# Altium schematic symbol library FPGA_Xilinx_Virtex7.SchLib: 34 symbols (part 29 of 34) (continued)
## XC7VX980T-FFG1926 (continued)
part P pins: A39 MGTHRXP3_218 (io), A40 MGTHRXN3_218 (io), B41 MGTHTXP3_218 (io), B42 MGTHTXN3_218 (io), C39 MGTHRXP2_218 (io), C40 MGTHRXN2_218 (io), C43 MGTHTXP2_218 (io), C44 MGTHTXN2_218 (io), D37 MGTREFCLK0P_218 (io), D38 MGTREFCLK0N_218 (io), D41 MGTHRXP1_218 (io), D42 MGTHRXN1_218 (io), E39 MGTHRXP0_218 (io), E40 MGTHRXN0_218 (io), E43 MGTHTXP1_218 (io), E44 MGTHTXN1_218 (io), F37 MGTREFCLK1P_218 (io), F38 MGTREFCLK1N_218 (io), F41 MGTHTXP0_218 (io), F42 MGTHTXN0_218 (io), G39 MGTHRXP3_217 (io), G40 MGTHRXN3_217 (io), G43 MGTHTXP3_217 (io), G44 MGTHTXN3_217 (io), H41 MGTHRXP2_217 (io), H42 MGTHRXN2_217 (io), J39 MGTHRXP1_217 (io), J40 MGTHRXN1_217 (io), J43 MGTHTXP2_217 (io), J44 MGTHTXN2_217 (io), K37 MGTREFCLK0P_217 (io), K38 MGTREFCLK0N_217 (io), K41 MGTHTXP1_217 (io), K42 MGTHTXN1_217 (io), L39 MGTHRXP0_217 (io), L40 MGTHRXN0_217 (io), L43 MGTHTXP0_217 (io), L44 MGTHTXN0_217 (io), M37 MGTREFCLK1P_217 (io), M38 MGTREFCLK1N_217 (io)
part Q pins: AA8 MGTAVCC_G11 (power), AA37 MGTAVCC_G21 (power), AB6 MGTAVCC_G11 (power), AB39 MGTAVCC_G21 (power), AC4 MGTAVTT_G11 (power), AC41 MGTAVTT_G21 (power), AD2 MGTAVTT_G11 (power), AD43 MGTAVTT_G21 (power), AE8 MGTAVCC_G11 (power), AE37 MGTAVCC_G21 (power), AF6 MGTAVCC_G11 (power), AF39 MGTAVCC_G21 (power), AG4 MGTAVTT_G11 (power), AG41 MGTAVTT_G21 (power), AH2 MGTAVTT_G11 (power), AH43 MGTAVTT_G21 (power), AJ8 MGTAVCC_G11 (power), AJ37 MGTAVCC_G21 (power), AK6 MGTAVCC_G11 (power), AK39 MGTAVCC_G21 (power), AL4 MGTAVTT_G11 (power), AL41 MGTAVTT_G21 (power), AM2 MGTAVTT_G11 (power), AM43 MGTAVTT_G21 (power), AN8 MGTVCCAUX_G10 (power), AN37 MGTVCCAUX_G20 (power), AP6 MGTAVCC_G10 (power), AP39 MGTAVCC_G20 (power), AR4 MGTAVTT_G10 (power), AR8 MGTAVCC_G10 (power), AR37 MGTAVCC_G20 (power), AR41 MGTAVTT_G20 (power), AT2 MGTAVTT_G10 (power), AT43 MGTAVTT_G20 (power), AV6 MGTAVCC_G10 (power), AV39 MGTAVCC_G20 (power), AW4 MGTAVTT_G10 (power), AW8 MGTAVCC_G10 (power), AW37 MGTAVCC_G20 (power), AW41 MGTAVTT_G20 (power), AY2 MGTAVTT_G10 (power), AY43 MGTAVTT_G20 (power), B6 MGTAVCC_G12 (power), B39 MGTAVCC_G22 (power), BB6 MGTAVCC_G10 (power), BB39 MGTAVCC_G20 (power), BC4 MGTAVTT_G10 (power), BC41 MGTAVTT_G20 (power), C4 MGTAVTT_G12 (power), C41 MGTAVTT_G22 (power), D2 MGTAVTT_G12 (power), D43 MGTAVTT_G22 (power), E8 MGTAVCC_G12 (power), E37 MGTAVCC_G22 (power), F6 MGTAVCC_G12 (power), F39 MGTAVCC_G22 (power), G4 MGTAVTT_G12 (power), G41 MGTAVTT_G22 (power), H2 MGTAVTT_G12 (power), H43 MGTAVTT_G22 (power), J8 MGTAVCC_G12 (power), J37 MGTAVCC_G22 (power), K6 MGTAVCC_G12 (power), K39 MGTAVCC_G22 (power), L4 MGTAVTT_G12 (power), L41 MGTAVTT_G22 (power), M2 MGTAVTT_G12 (power), M43 MGTAVTT_G22 (power), N8 MGTAVCC_G12 (power), N37 MGTAVCC_G22 (power), P6 MGTAVCC_G12 (power), P39 MGTAVCC_G22 (power), R4 MGTAVTT_G12 (power), R41 MGTAVTT_G22 (power), T2 MGTAVTT_G12 (power), T43 MGTAVTT_G22 (power), U8 MGTVCCAUX_G12 (power), U37 MGTVCCAUX_G22 (power), V6 MGTAVCC_G11 (power), V39 MGTAVCC_G21 (power), W4 MGTAVTT_G11 (power), W8 MGTVCCAUX_G11 (power), W37 MGTVCCAUX_G21 (power), W41 MGTAVTT_G21 (power), Y2 MGTAVTT_G11 (power), Y7 MGTAVTTRCAL_115 (power), Y8 MGTRREF_115 (power), Y37 MGTRREF_215 (power), Y38 MGTAVTTRCAL_215 (power), Y43 MGTAVTT_G21 (power)
part R pins: AA10 CFGBVS_0 (io), AA35 TDO_0 (io), AB11 M1_0 (io), AB22 VREFN_0 (io), AB23 VP_0 (io), AC10 M0_0 (io), AC22 VN_0 (io), AC23 VREFP_0 (io), AC35 TCK_0 (io), AD11 M2_0 (io), AD22 DXN_0 (io), AD23 DXP_0 (io), AD35 VCCO_0 (power), AE10 DONE_0 (io), AE35 TDI_0 (io), AF35 VCCO_0 (power), AG35 TMS_0 (io), W10 INIT_B_0 (io), W35 CCLK_0 (io), Y11 PROGRAM_B_0 (io)
part S pins: A3 GND (power), A4 GND (power), A7 GND (power), A12 GND (power), A22 GND (power), A32 GND (power), A38 GND (power), A41 GND (power), A42 GND (power), AA11 VCCINT (power), AA13 VCCINT (power), AA15 VCCINT (power), AA17 VCCAUX (power), AA19 VCCINT (power), AA21 VCCINT (power), AA22 GNDADC_0 (power), AA23 VCCADC_0 (power), AA25 VCCAUX_IO_G1 (power), AA27 VCCAUX (power), AA29 VCCINT (power), AA31 VCCINT (power), AA33 VCCINT (power), AB12 VCCINT (power), AB14 VCCINT (power), AB16 VCCINT (power), AB18 VCCAUX_IO_G4 (power), AB20 VCCINT (power), AB24 VCCBRAM (power), AB26 VCCAUX_IO_G1 (power), AB28 VCCINT (power), AB30 VCCINT (power), AB32 VCCINT (power), AB34 VCCINT (power), AC11 VCCINT (power), AC13 VCCINT (power), AC15 VCCINT (power), AC17 VCCAUX (power), AC19 VCCINT (power), AC21 VCCINT (power), AC25 VCCAUX_IO_G1 (power), AC27 VCCAUX (power), AC29 VCCINT (power), AC31 VCCINT (power), AC33 VCCINT (power), AD12 VCCINT (power), AD14 VCCINT (power), AD16 VCCINT (power), AD18 VCCAUX_IO_G4 (power), AD20 VCCINT (power), AD24 VCCBRAM (power), AD26 VCCAUX_IO_G0 (power), AD28 VCCINT (power), AD30 VCCINT (power), AD32 VCCINT (power), AD34 VCCINT (power), AE11 VCCINT (power), AE13 VCCINT (power), AE15 VCCINT (power), AE17 VCCAUX (power), AE19 VCCAUX_IO_G3 (power), AE21 VCCINT (power), AE23 VCCBRAM (power), AE25 VCCAUX_IO_G0 (power), AE27 VCCAUX (power), AE29 VCCINT (power), AE31 VCCINT (power), AE33 VCCINT (power), AF12 VCCINT (power), AF14 VCCINT (power), AF16 VCCINT (power), AF18 VCCAUX_IO_G3 (power), AF20 VCCINT (power), AF22 VCCINT (power), AF24 VCCBRAM (power), AF26 VCCAUX_IO_G0 (power), AF28 VCCINT (power), AF30 VCCINT (power), AF32 VCCINT (power), AF34 VCCINT (power), AG11 VCCINT (power), AG13 VCCINT (power), AG15 VCCINT (power), AG17 VCCAUX (power), AG19 VCCAUX_IO_G3 (power), AG21 VCCINT (power), AG23 VCCINT (power), AG25 VCCBRAM (power), AG27 VCCAUX (power), AG29 VCCINT (power), AG31 VCCINT (power), AG33 VCCINT (power), AH14 VCCINT (power), AH20 VCCINT (power), AH22 VCCINT (power), AH24 VCCBRAM (power), AH32 VCCINT (power), AH34 VCCINT (power), B2 GND (power), B5 GND (power), B7 GND (power), B9 GND (power), B19 GND (power), B29 GND (power), B38 GND (power), B40 GND (power), B43 GND (power), C3 GND (power), C7 GND (power), C8 GND (power), C9 GND (power), C16 GND (power), C26 GND (power), C36 GND (power), C37 GND (power), C38 GND (power), C42 GND (power), D1 GND (power), D5 GND (power), D6 GND (power), D9 GND (power), D13 GND (power), D23 GND (power), D33 GND (power), D36 GND (power), D39 GND (power), D40 GND (power), D44 GND (power), E3 GND (power), E4 GND (power), E7 GND (power), E9 GND (power), E10 GND (power), E20 GND (power), E30 GND (power), E36 GND (power), E38 GND (power), E41 GND (power), E42 GND (power), F1 GND (power), F2 GND (power), F5 GND (power), F9 GND (power), F17 GND (power), F27 GND (power), F36 GND (power), F40 GND (power), F43 GND (power), F44 GND (power), G3 GND (power), G7 GND (power), G8 GND (power), G9 GND (power), G14 GND (power), G24 GND (power), G34 GND (power), G36 GND (power), G37 GND (power), G38 GND (power), G42 GND (power), H1 GND (power), H5 GND (power), H6 GND (power), H9 GND (power), H11 GND (power), H21 GND (power), H31 GND (power), H36 GND (power), H39 GND (power), H40 GND (power), H44 GND (power), J3 GND (power), J4 GND (power), J7 GND (power), J9 GND (power), J18 GND (power), J28 GND (power), J36 GND (power), J38 GND (power), J41 GND (power), J42 GND (power), K1 GND (power), K2 GND (power), K5 GND (power), K9 GND (power), K15 GND (power), K25 GND (power), K35 GND (power), K36 GND (power), U35 VCCBATT_0 (power), V12 VCCINT (power), V14 VCCINT (power), V24 VCCBRAM (power), V26 VCCAUX_IO_G2 (power), V34 VCCINT (power), W11 VCCINT (power), W13 VCCINT (power), W15 VCCINT (power), W17 VCCAUX (power), W19 VCCAUX_IO_G5 (power), W21 VCCINT (power), W23 VCCBRAM (power), W25 VCCBRAM (power), W27 VCCAUX (power), W29 VCCINT (power), W31 VCCINT (power), W33 VCCINT (power), Y12 VCCINT (power), Y14 VCCINT (power), Y16 VCCINT (power), Y18 VCCAUX_IO_G4 (power), Y20 VCCINT (power), Y22 VCCINT (power), Y24 VCCBRAM (power), Y26 VCCAUX_IO_G2 (power), Y28 VCCINT (power), Y30 VCCINT (power), Y32 VCCINT (power), Y34 VCCINT (power)
part T pins: AA3 GND (power), AA4 GND (power), AA7 GND (power), AA9 GND (power), AA12 GND (power), AA14 GND (power), AA16 GND (power), AA18 GND (power), AA20 GND (power), AA24 GND (power), AA26 GND (power), AA28 GND (power), AA30 GND (power), AA32 GND (power), AA34 GND (power), AA36 GND (power), AA38 GND (power), AA41 GND (power), AA42 GND (power), AB1 GND (power), AB2 GND (power), AB5 GND (power), AB9 GND (power), AB10 GND (power), AB13 GND (power), AB15 GND (power), AB17 GND (power), AB19 GND (power), AB21 GND (power), AB25 GND (power), AB27 GND (power), AB29 GND (power), AB31 GND (power), AB33 GND (power), AB35 GND (power), AB36 GND (power), AB40 GND (power), AB43 GND (power), AB44 GND (power), AC3 GND (power), AC7 GND (power), AC8 GND (power), AC9 GND (power), AC12 GND (power), AC14 GND (power), AC16 GND (power), AC18 GND (power), AC20 GND (power), AC24 GND (power), AC26 GND (power), AC28 GND (power), AC30 GND (power), AC32 GND (power), AC34 GND (power), AC36 GND (power), AC37 GND (power), AC38 GND (power), AC42 GND (power), AD1 GND (power), AD5 GND (power), AD6 GND (power), AD9 GND (power), AD10 GND (power), AD13 GND (power), AD15 GND (power), AD17 GND (power), AD19 GND (power), AD21 GND (power), AD25 GND (power), AD27 GND (power), AD29 GND (power), AD31 GND (power), AD33 GND (power), AD36 GND (power), AD39 GND (power), AD40 GND (power), AD44 GND (power), AE3 GND (power), AE4 GND (power), AE7 GND (power), AE9 GND (power), AE12 GND (power), AE14 GND (power), AE16 GND (power), AE18 GND (power), AE20 GND (power), AE22 GND (power), AE24 GND (power), AE26 GND (power), AE28 GND (power), AE30 GND (power), AE32 GND (power), AE34 GND (power), AE36 GND (power), AE38 GND (power), AE41 GND (power), AE42 GND (power), AF1 GND (power), AF2 GND (power), AF5 GND (power), AF9 GND (power), AF10 GND (power), AF11 GND (power), AF13 GND (power), AF15 GND (power), AF17 GND (power), AF19 GND (power), AF21 GND (power), AF23 GND (power), AF25 GND (power), AF27 GND (power), AF29 GND (power), AF31 GND (power), AF33 GND (power), AF36 GND (power), AF40 GND (power), AF43 GND (power), AF44 GND (power), AG3 GND (power), AG7 GND (power), AG8 GND (power), AG9 GND (power), AG10 GND (power), AG12 GND (power), AG14 GND (power), AG16 GND (power), AG18 GND (power), AG20 GND (power), AG22 GND (power), AG24 GND (power), AG26 GND (power), AG28 GND (power), AG30 GND (power), AG32 GND (power), AG34 GND (power), AG36 GND (power), AG37 GND (power), AG38 GND (power), AG42 GND (power), AH1 GND (power), AH5 GND (power), AH6 GND (power), AH9 GND (power), AH11 GND (power), AH13 GND (power), AH15 GND (power), AH19 GND (power), AH21 GND (power), AH23 GND (power), AH25 GND (power), AH31 GND (power), AH33 GND (power), AH35 GND (power), AH36 GND (power), AH39 GND (power), AH40 GND (power), AH44 GND (power), AJ3 GND (power), AJ4 GND (power), AJ7 GND (power), AJ9 GND (power), AJ18 GND (power), AJ28 GND (power), AJ36 GND (power), AJ38 GND (power), AJ41 GND (power), AJ42 GND (power), AK1 GND (power), AK2 GND (power), K40 GND (power), K43 GND (power), K44 GND (power), L3 GND (power), L7 GND (power), L8 GND (power), L9 GND (power), L12 GND (power), L22 GND (power), L32 GND (power), L36 GND (power), L37 GND (power), L38 GND (power), L42 GND (power), M1 GND (power), M5 GND (power), M6 GND (power), M9 GND (power), M19 GND (power), M29 GND (power), M36 GND (power), M39 GND (power), M40 GND (power), M44 GND (power), N3 GND (power), N4 GND (power), N7 GND (power), N9 GND (power), N16 GND (power), N26 GND (power), N36 GND (power), N38 GND (power), N41 GND (power), N42 GND (power), P1 GND (power), P2 GND (power), P5 GND (power), P9 GND (power), P13 GND (power), P23 GND (power), P33 GND (power), P36 GND (power), P40 GND (power), P43 GND (power), P44 GND (power), R3 GND (power), R7 GND (power), R8 GND (power), R9 GND (power), R10 GND (power), R20 GND (power), R30 GND (power), R36 GND (power), R37 GND (power), R38 GND (power), R42 GND (power), T1 GND (power), T5 GND (power), T6 GND (power), T9 GND (power), T17 GND (power), T27 GND (power), T34 GND (power), T35 GND (power), T36 GND (power), T39 GND (power), T40 GND (power), T44 GND (power), U3 GND (power), U4 GND (power), U7 GND (power), U9 GND (power), U14 GND (power), U24 GND (power), U34 GND (power), U36 GND (power), U38 GND (power), U41 GND (power), U42 GND (power), V1 GND (power), V2 GND (power), V5 GND (power), V9 GND (power), V10 GND (power), V11 GND (power), V21 GND (power), V23 GND (power), V25 GND (power), V31 GND (power), V35 GND (power), V36 GND (power), V40 GND (power), V43 GND (power), V44 GND (power), W3 GND (power), W7 GND (power), W9 GND (power), W12 GND (power), W14 GND (power), W16 GND (power), W18 GND (power), W20 GND (power), W22 GND (power), W24 GND (power), W26 GND (power), W28 GND (power), W30 GND (power), W32 GND (power), W34 GND (power), W36 GND (power), W38 GND (power), W42 GND (power), Y1 GND (power), Y5 GND (power), Y6 GND (power), Y9 GND (power), Y10 GND (power), Y13 GND (power), Y15 GND (power), Y17 GND (power), Y19 GND (power), Y21 GND (power), Y23 GND (power), Y25 GND (power), Y27 GND (power), Y29 GND (power), Y31 GND (power), Y33 GND (power), Y35 GND (power), Y36 GND (power), Y39 GND (power), Y40 GND (power), Y44 GND (power)
part U pins: AK5 GND (power), AK9 GND (power), AK15 GND (power), AK25 GND (power), AK35 GND (power), AK36 GND (power), AK40 GND (power), AK43 GND (power), AK44 GND (power), AL3 GND (power), AL7 GND (power), AL8 GND (power), AL9 GND (power), AL12 GND (power), AL22 GND (power), AL32 GND (power), AL36 GND (power), AL37 GND (power), AL38 GND (power), AL42 GND (power), AM1 GND (power), AM5 GND (power), AM6 GND (power), AM9 GND (power), AM19 GND (power), AM29 GND (power), AM36 GND (power), AM39 GND (power), AM40 GND (power), AM44 GND (power), AN3 GND (power), AN4 GND (power), AN7 GND (power), AN9 GND (power), AN16 GND (power), AN26 GND (power), AN36 GND (power), AN38 GND (power), AN41 GND (power), AN42 GND (power), AP1 GND (power), AP2 GND (power), AP5 GND (power), AP9 GND (power), AP13 GND (power), AP23 GND (power), AP33 GND (power), AP36 GND (power), AP40 GND (power), AP43 GND (power), AP44 GND (power), AR3 GND (power), AR7 GND (power), AR9 GND (power), AR10 GND (power), AR20 GND (power), AR30 GND (power), AR36 GND (power), AR38 GND (power), AR42 GND (power), AT1 GND (power), AT5 GND (power), AT6 GND (power), AT9 GND (power), AT17 GND (power), AT27 GND (power), AT36 GND (power), AT39 GND (power), AT40 GND (power), AT44 GND (power), AU3 GND (power), AU4 GND (power), AU7 GND (power), AU8 GND (power), AU9 GND (power), AU14 GND (power), AU24 GND (power), AU34 GND (power), AU36 GND (power), AU37 GND (power), AU38 GND (power), AU41 GND (power), AU42 GND (power), AV1 GND (power), AV2 GND (power), AV5 GND (power), AV9 GND (power), AV11 GND (power), AV21 GND (power), AV31 GND (power), AV36 GND (power), AV40 GND (power), AV43 GND (power), AV44 GND (power), AW3 GND (power), AW7 GND (power), AW9 GND (power), AW18 GND (power), AW28 GND (power), AW36 GND (power), AW38 GND (power), AW42 GND (power), AY1 GND (power), AY5 GND (power), AY6 GND (power), AY9 GND (power), AY15 GND (power), AY25 GND (power), AY35 GND (power), AY36 GND (power), AY39 GND (power), AY40 GND (power), AY44 GND (power), BA3 GND (power), BA4 GND (power), BA7 GND (power), BA8 GND (power), BA9 GND (power), BA12 GND (power), BA22 GND (power), BA32 GND (power), BA36 GND (power), BA37 GND (power), BA38 GND (power), BA41 GND (power), BA42 GND (power), BB1 GND (power), BB2 GND (power), BB5 GND (power), BB7 GND (power), BB9 GND (power), BB19 GND (power), BB29 GND (power), BB38 GND (power), BB40 GND (power), BB43 GND (power), BB44 GND (power), BC2 GND (power), BC3 GND (power), BC7 GND (power), BC16 GND (power), BC26 GND (power), BC36 GND (power), BC38 GND (power), BC42 GND (power), BC43 GND (power), BD5 GND (power), BD6 GND (power), BD7 GND (power), BD13 GND (power), BD23 GND (power), BD33 GND (power), BD38 GND (power), BD39 GND (power), BD40 GND (power)

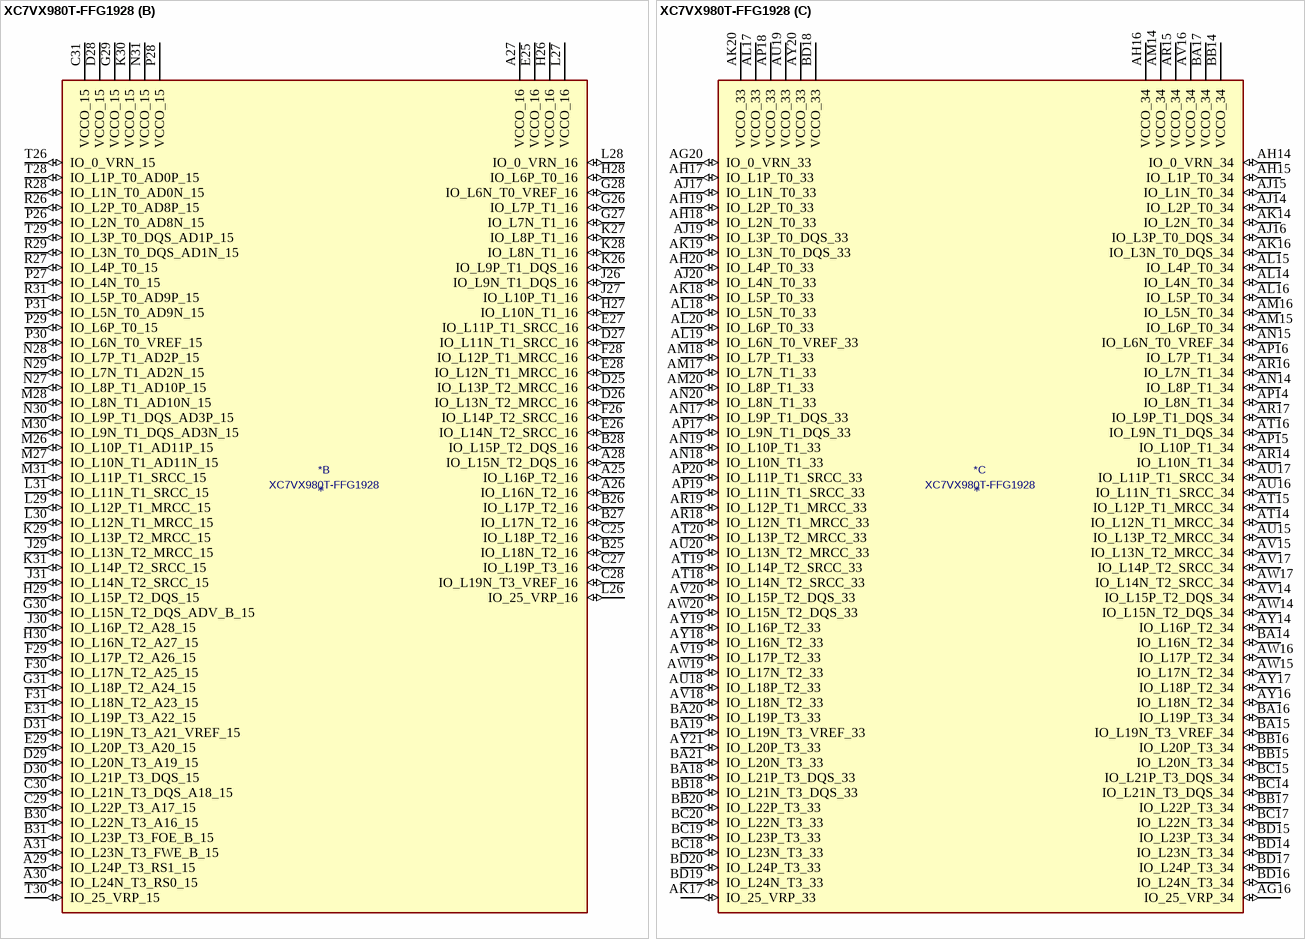
[diagram p145: symbol XC7VX980T-FFG1928]

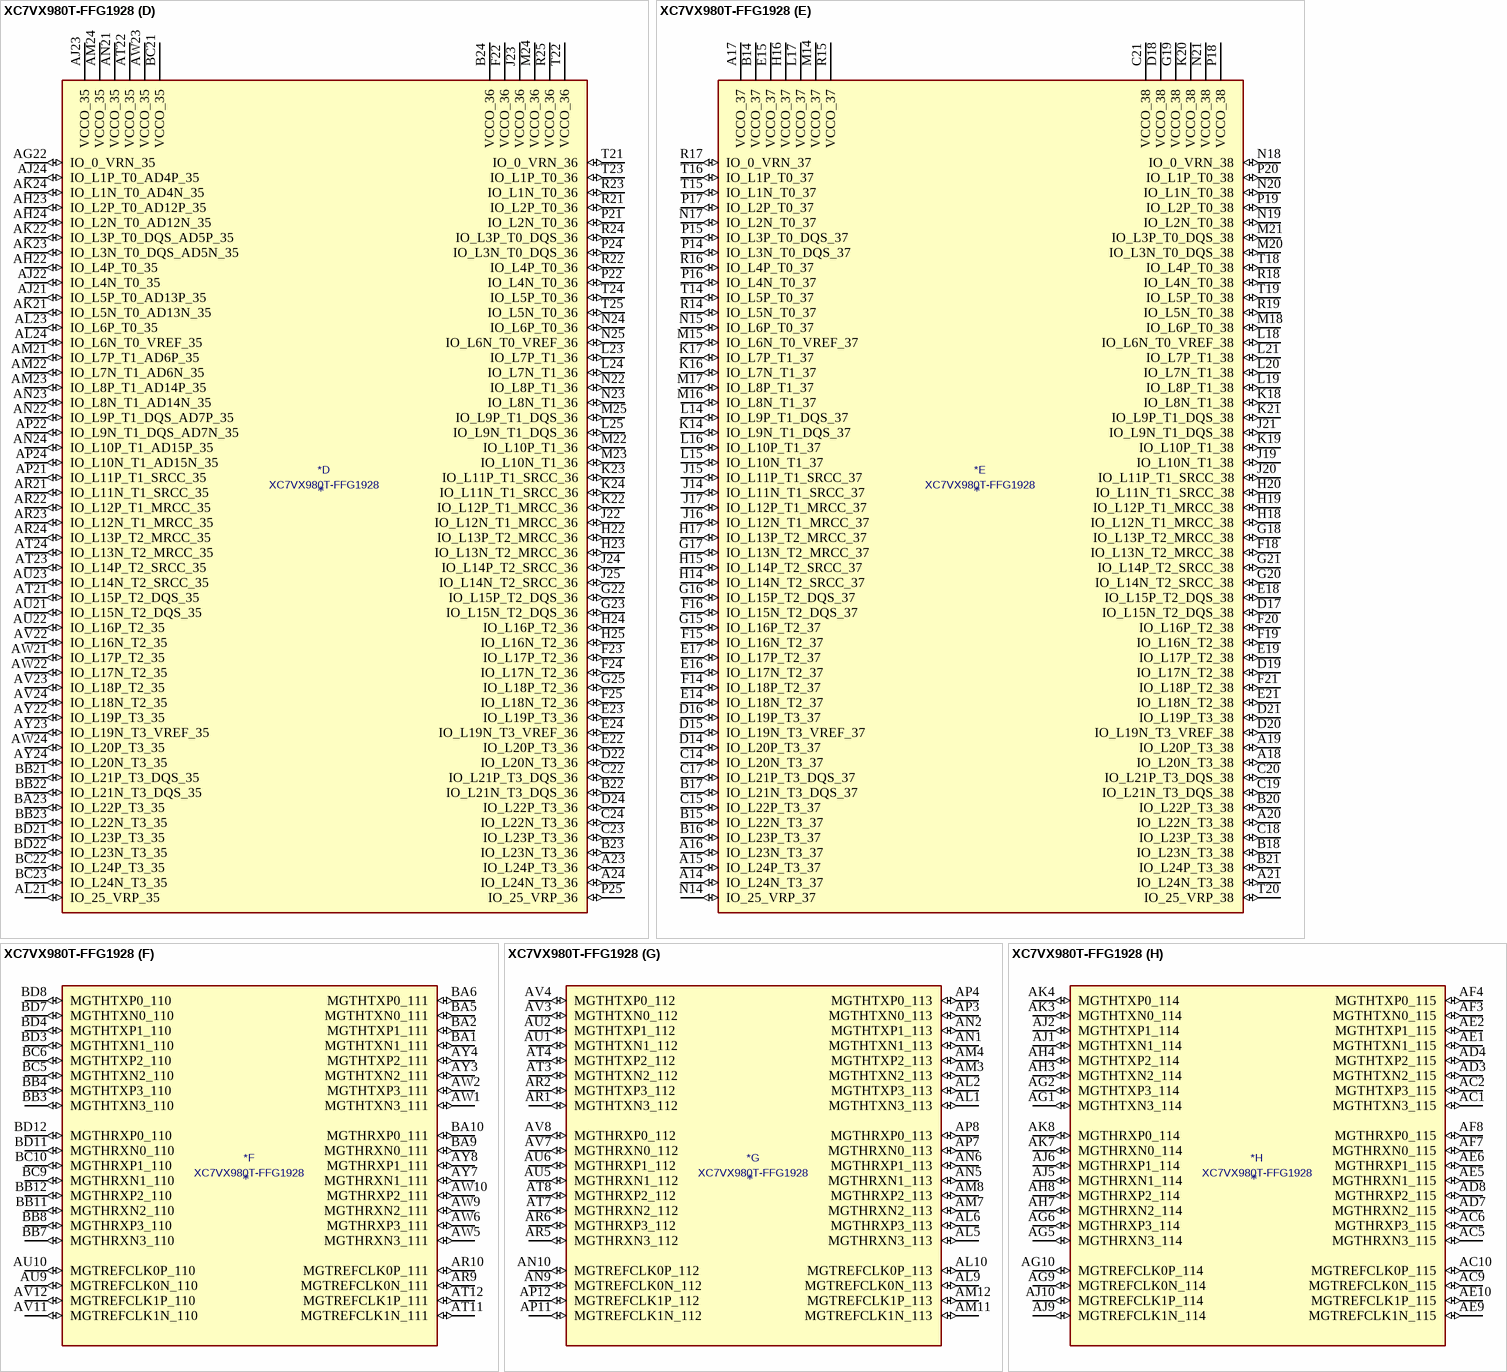
[diagram p146: symbol XC7VX980T-FFG1928]

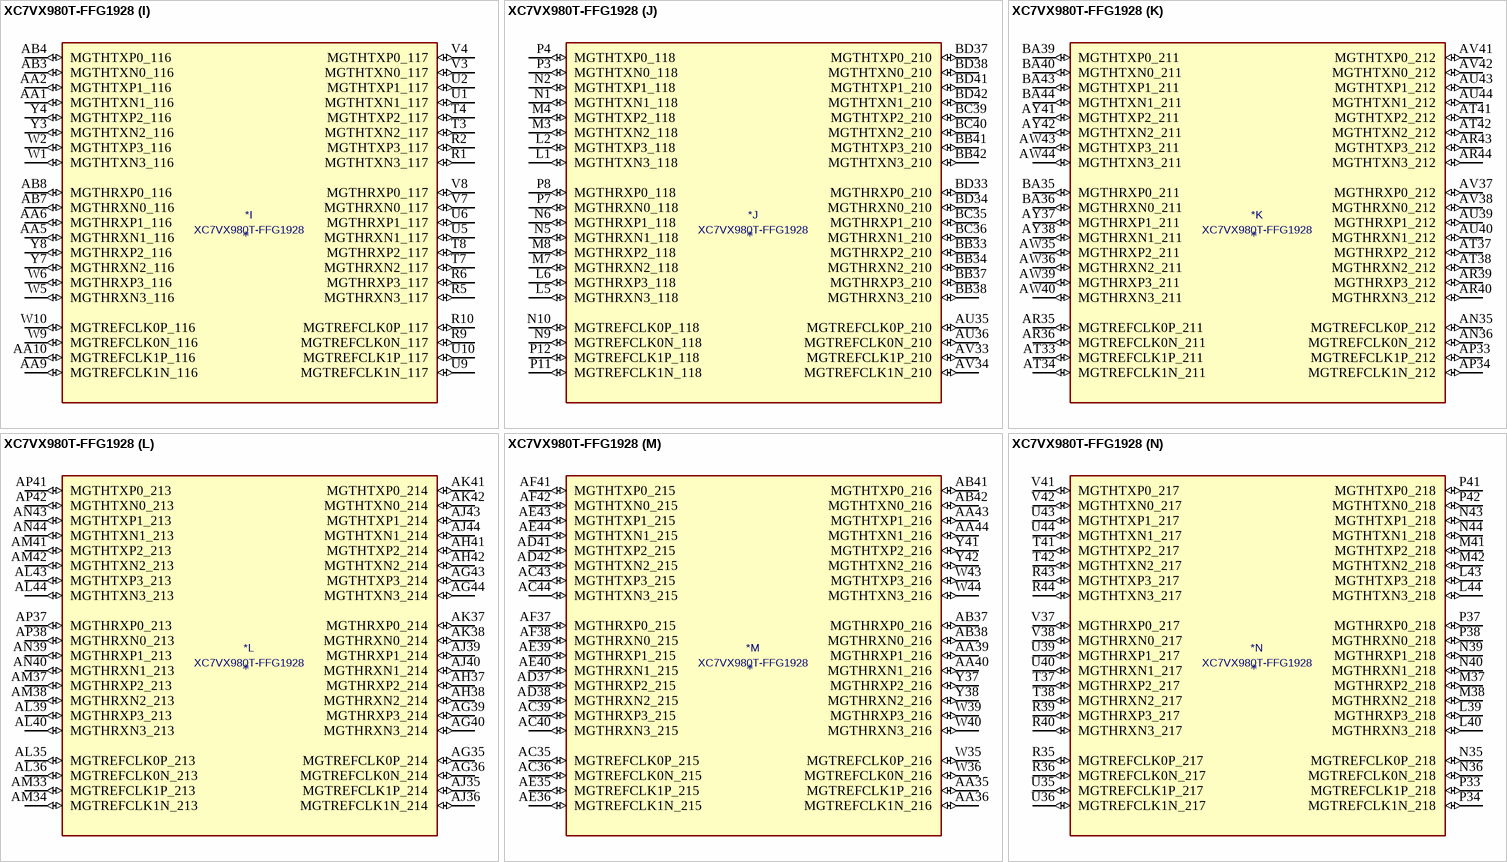
[diagram p147: symbol XC7VX980T-FFG1928]

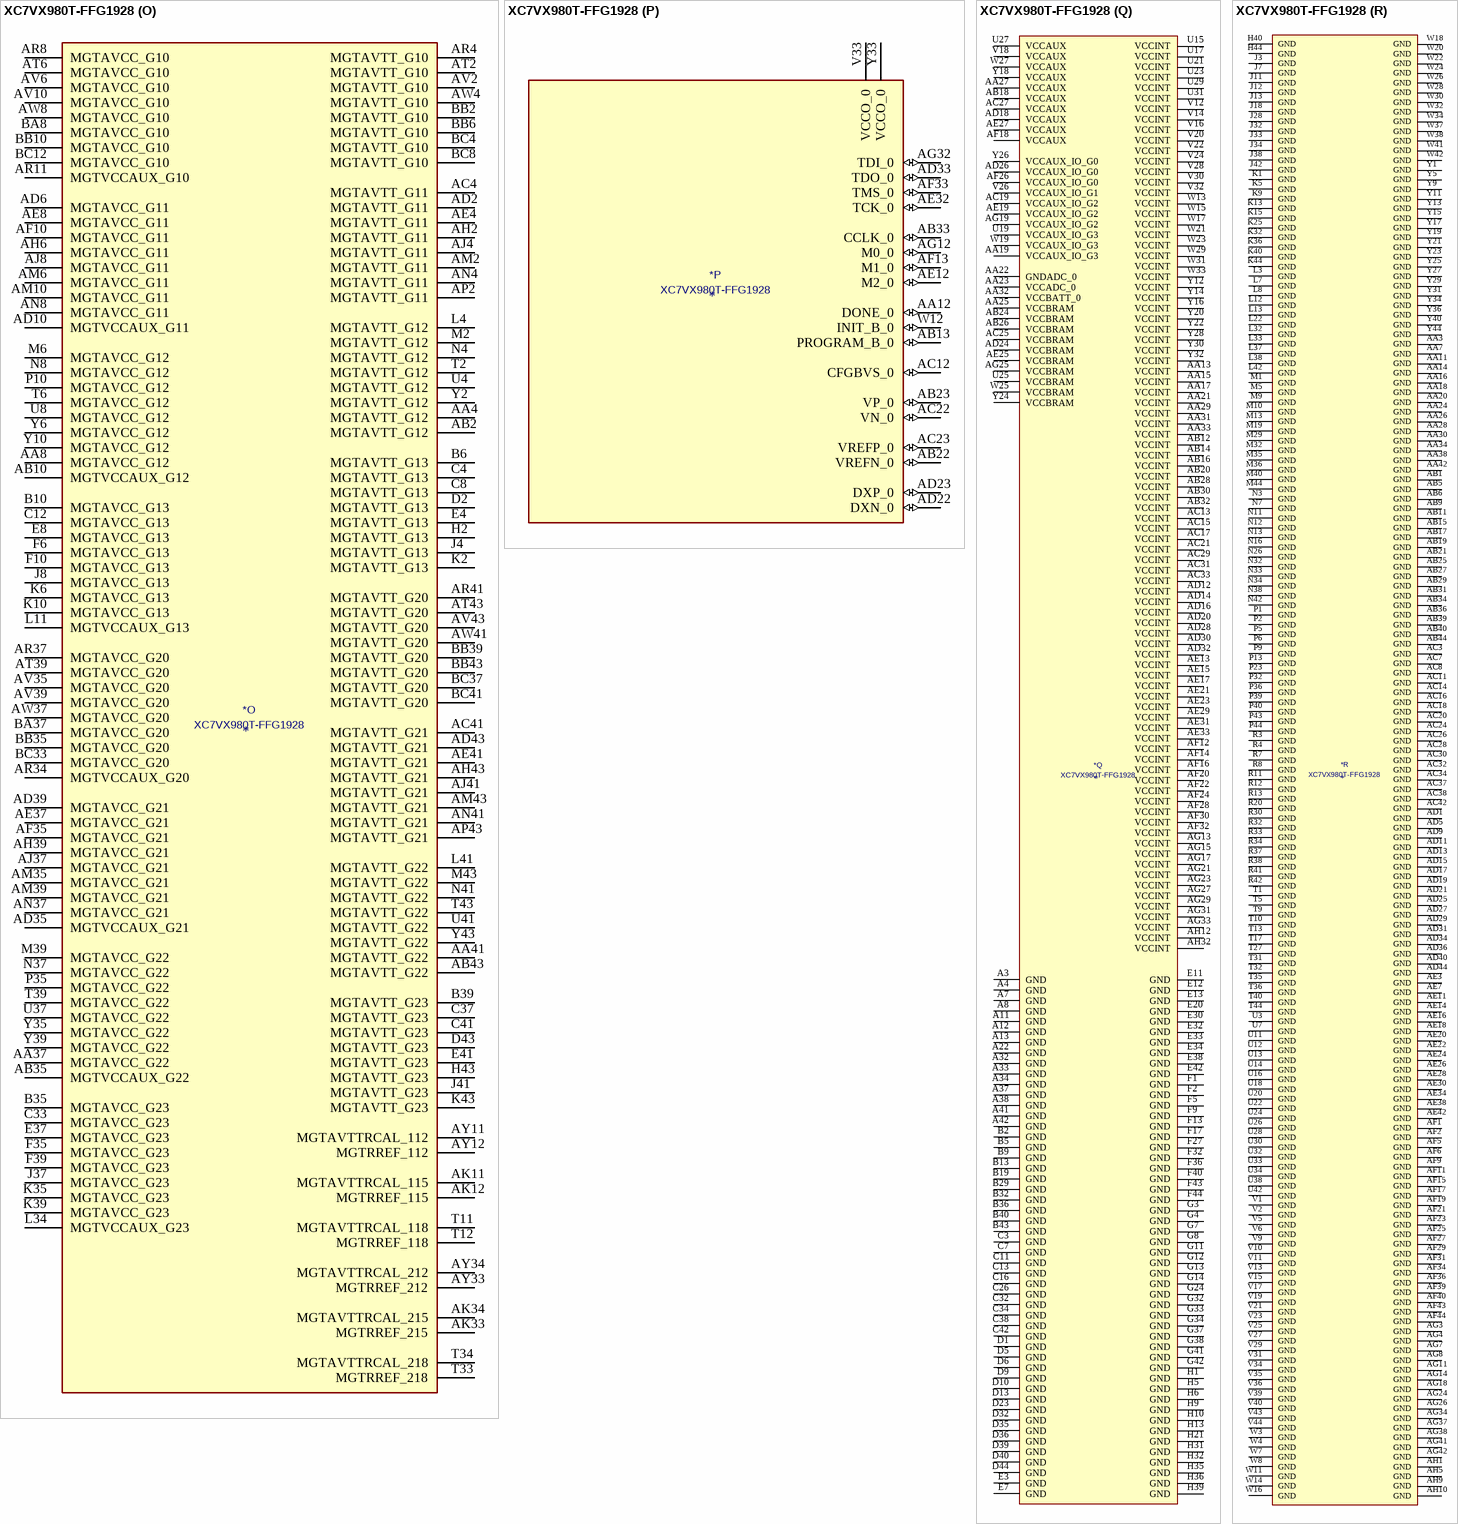
[diagram p148: symbol XC7VX980T-FFG1928]

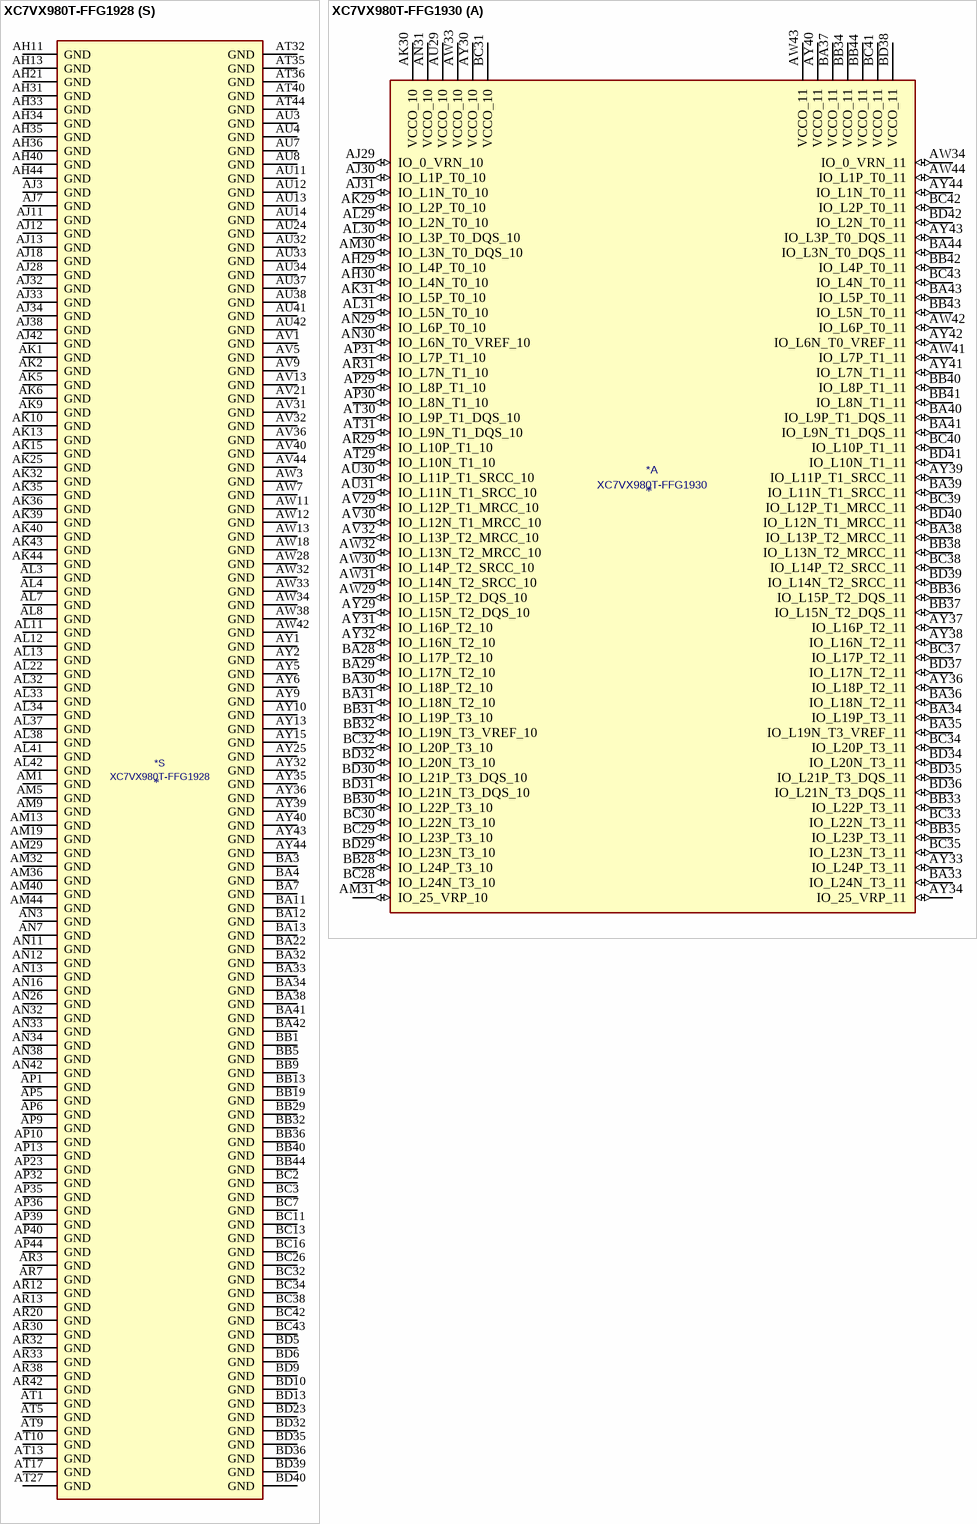
[diagram p149: symbols XC7VX980T-FFG1928 to XC7VX980T-FFG1930]